# Altium footprint library User.PcbLib: 317 footprints (part 5 of 20)
Each footprint in its own frame and in the unit in brackets; x right, y up, seen from the top. Pads: shape width x height; smd on the part's side, far side on the other; paste and mask are expansions set on the pad; w line width, h text height; cw(c..) or ccw(c..) is an arc to the next point about the centre after c.
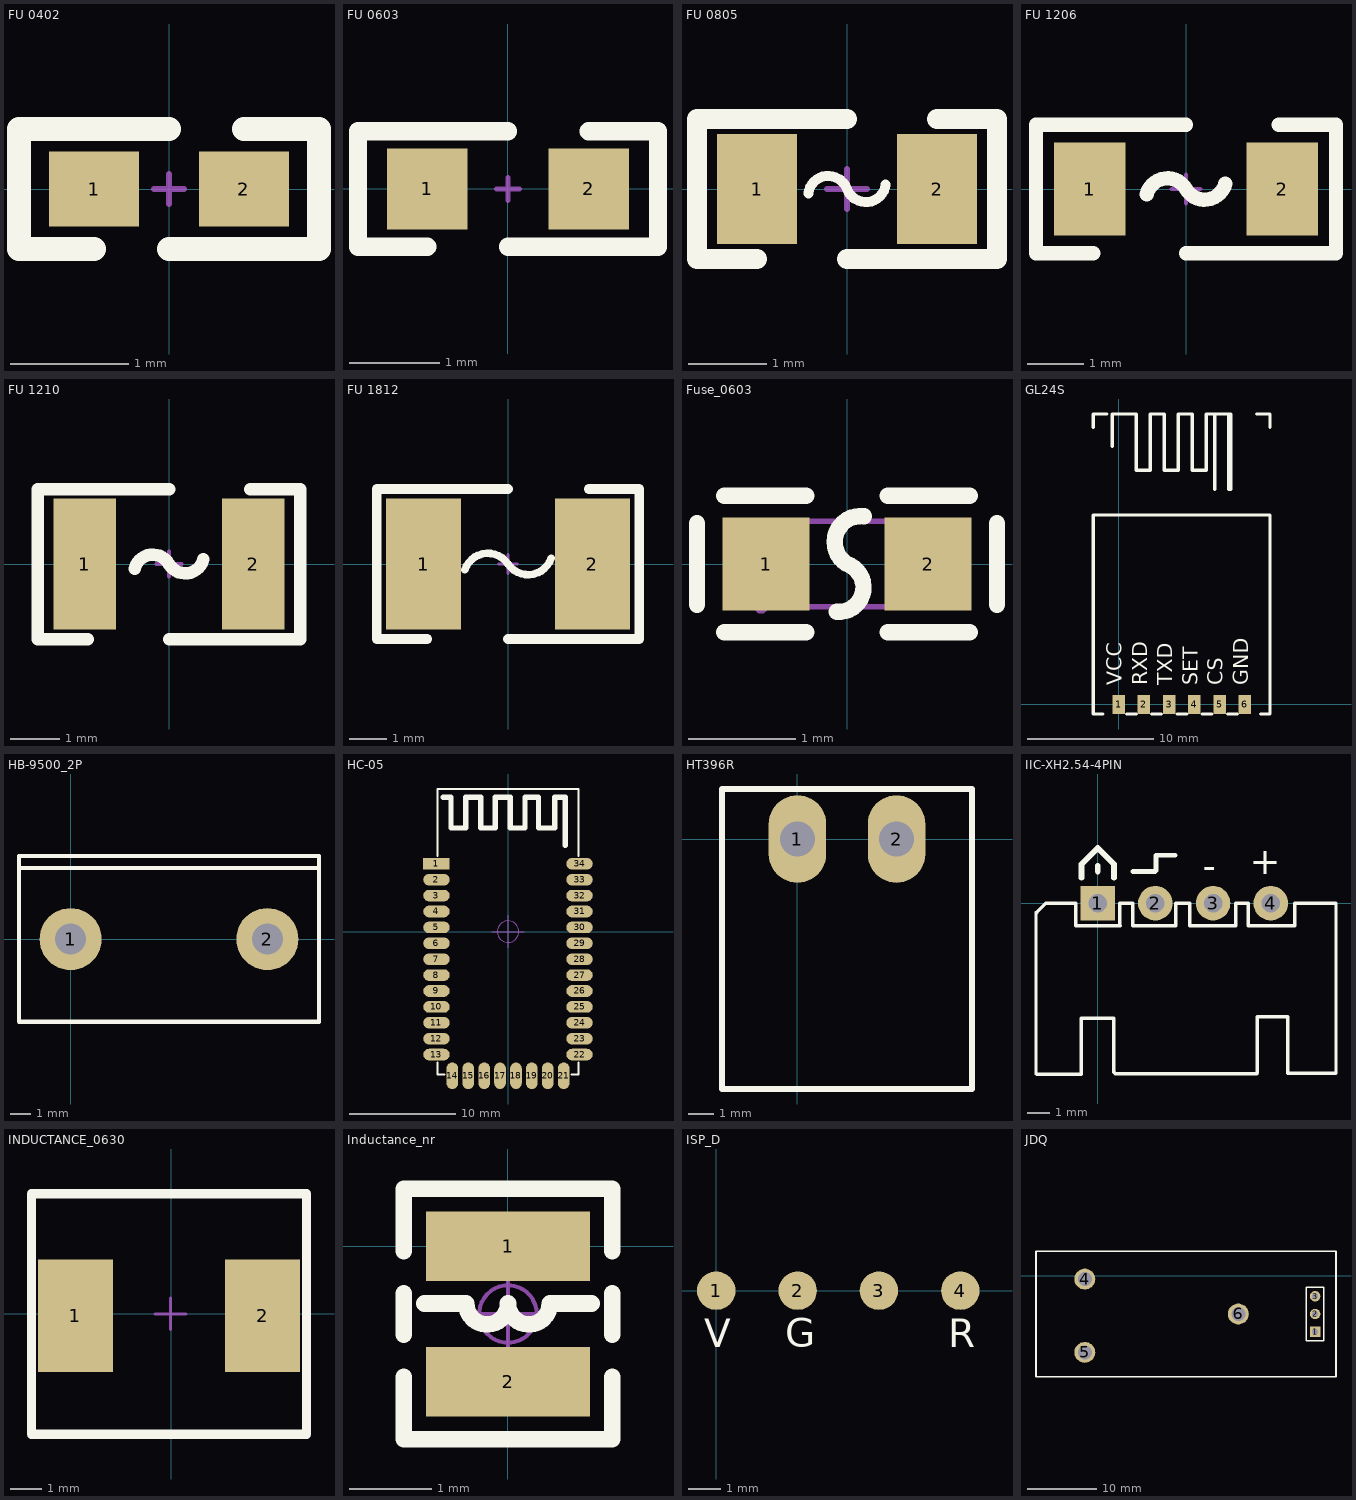
[diagram p4: the footprints below, top view; thin cyan lines are the x and y axes]

## FU 0402 [mil] "贴片保险丝"
pads (2):
  rect 30x25 smd: 1(-25,0) 2(25,0)
Top Overlay:
  lines w8: -25,-20 -50,-20 -50,20 -40,20 -25,20 0,20 ; 0,-20 25,-20 50,-20 50,20 25,20
Mechanical 15:
  lines w2: -5,0 5,0 ; 0,-5 0,5
3D body "FU 0402.STEP": height 14.57, standoff 0, extent -19.69,-10.24 19.69,10.24

## FU 0603 [mil] "贴片保险丝"
pads (2):
  rect 35x35 smd: 1(-35,0) 2(35,0)
Top Overlay:
  lines w8: -35,-25 -65,-25 -65,25 -40,25 0,25 ; 0,-25 40,-25 65,-25 65,25 35,25
Mechanical 15:
  lines w2: -5,0 5,0 ; 0,-5 0,0 0,5
3D body "FU 0603.STEP": height 20.47, standoff 0, extent -31.5,-16.14 31.5,16.14

## FU 0805 [mil] "贴片保险丝"
pads (2):
  rect 40x55 smd: 1(-45,0) 2(45,0)
Top Overlay:
  lines w5: -19.33,-2.28 cw(c-9.4,-3.42) 0,0 ccw(c9.4,3.42) 19.33,2.28
  lines w10: -45,-35 -75,-35 -75,35 -45,35 0,35 ; 0,-35 60,-35 ; 45,35 75,35 75,-35 50,-35
Mechanical 15:
  lines w3: -10,0 10,0 ; 0,-10 0,10
3D body "FU 0805.STEP": height 20.47, standoff 0, extent -39.37,-24.02 39.37,24.02

## FU 1206 [mil] "贴片保险丝"
pads (2):
  rect 50x65 smd: 1(-67.5,0) 2(67.5,0)
Top Overlay:
  lines w10: -90,45 0,45 ; -65,-45 -105,-45 -105,45 -65,45 ; -27.48,-3.62 cw(c-12.99,-7.5) 0,0 ccw(c12.99,7.5) 27.48,3.62 ; 0,-45 90,-45 ; 65,-45 105,-45 105,45 65,45
Mechanical 15:
  lines w3: -10,0 10,0 ; 0,-10 0,10
3D body "FU 01206.STEP": height 34.25, standoff 0, extent -62.99,-31.89 62.99,31.89

## FU 1210 [mil] "贴片保险丝"
pads (2):
  rect 50x105 smd: 1(-67.5,0) 2(67.5,0)
Top Overlay:
  lines w10: -90,60 0,60 ; -65,-60 -105,-60 -105,60 -65,60 ; -27.48,-3.62 cw(c-12.99,-7.5) 0,0 ccw(c12.99,7.5) 27.48,3.62 ; 0,-60 90,-60 ; 65,-60 105,-60 105,60 65,60
Mechanical 15:
  lines w3: -10,0 10,0 ; 0,-10 0,10
3D body "FU 01210.STEP": height 34.25, standoff 0, extent -62.99,-50.39 62.99,50.39

## FU 1812 [mm] "贴片保险丝"
pads (2):
  rect 2x3.5 smd: 1(-2.25,0) 2(2.25,0)
Top Overlay:
  lines w0.203: -1.15,-0.156 cw(c-0.537,-0.362) 0,0 ccw(c0.537,0.362) 1.15,0.156
  lines w0.254: -2.159,-2 -3.5,-2 -3.5,2 0,2 ; 0,-2 3.5,-2 3.5,2 2.159,2
Mechanical 15:
  lines w0.076: -0.254,0 0.254,0 ; 0,-0.254 0,0.254
3D body "FU 01812.STEP": height 0.87, standoff 0, extent -2.3,-1.61 2.3,1.61

## Fuse_0603 [mil]
pads (2):
  rect 31.8x34 smd mask+2: 1(-29.7,0) 2(29.7,0)
Top Overlay:
  lines w6: -55,-15 -55,15 ; -45,-25 -15,-25 ; -45,25 -15,25 ; -3.78,-17.5 ccw(c-2.98,-8.52) 0,0 ; -0.04,0 cw(c4.98,8.08) 6.21,17.5 ; 15,-25 45,-25 ; 15,25 45,25 ; 55,-15 55,15
Top Paste:
  region: 12.4,-5.4 12.4,5.4 23.2,17 43,17 45.5,14.5 45.5,-14.5 43,-17 23.2,-17
  region: -12.4,-5.4 -12.4,5.4 -23.2,17 -43,17 -45.5,14.5 -45.5,-14.5 -43,-17 -23.2,-17
Mechanical 15:
  region: -29.1,-15.7 -29.1,-14.71 -30.51,-13.3 -32.49,-13.3 -33.9,-14.71 -33.9,-15.7 -33.9,-16.69 -32.49,-18.1 -30.51,-18.1 -29.1,-16.69
  region: -31.5,-15.7 -31.5,15.7 -19.7,15.7 -19.7,-15.7
  region: 31.5,-15.7 31.5,15.7 19.7,15.7 19.7,-15.7
  lines w2: -31.5,-15.7 -31.5,15.7 31.5,15.7 31.5,-15.7 -31.5,-15.7
3D body "3D_PCB5_2022-03-06.step": height 29.5, standoff 1.97, extent -32.92,-17.7 33.95,17.7

## GL24S [mm]
pads (6):
  rect 1x1.5 smd: 1(0,0) 2(2,0) 3(4,0) 4(6,0) 5(8,0) 6(10,0)
Top Overlay:
  lines w0.254: -2,21.922 -2,23 -0.922,23 ; -1.238,-0.762 -2,-0.762 -2,15 12,15 ; -0.508,20.447 -0.508,23 1.397,23 1.397,18.542 2.508,18.542 2.508,23 3.619,23 3.619,18.542 4.73,18.542 4.73,23 5.841,23 5.841,18.542 6.952,18.542 6.952,23 8.877,23 ; 0.635,-0.762 1.397,-0.762 ; 2.635,-0.762 3.397,-0.762 ; 4.635,-0.762 5.397,-0.762 ; 6.635,-0.762 7.397,-0.762 ; 7.62,17.018 7.62,22.987 ; 8.635,-0.762 9.397,-0.762 ; 8.731,22.987 8.731,17.018 8.89,17.018 8.89,22.987 ; 10,15 12,15 ; 10.922,23 12,23 12,21.922 ; 11.238,-0.762 12,-0.762 12,15
  text "GND" at 10.65,1.524 h2.03
  text "CS" at 8.65,1.524 h2.03
  text "SET" at 6.65,1.524 h2.03
  text "TXD" at 4.667,1.524 h2.03
  text "RXD" at 2.667,1.526 h2.03
  text "VCC" at 0.65,1.524 h2.03
3D body: height 1.6, standoff 1, extent -2,-0.762 12,15
3D body: height 1.6, standoff 1, extent -2,15 12,23

## HB-9500_2P [mm] "2p_9.5mm"
pads (2):
  round 3 hole 1.5: 1(0,0) 2(9.5,0)
Top Overlay:
  lines w0.2: -2.489,3.429 11.989,3.429 ; 11.989,-4 11.989,4 ; 11.989,-3.988 -2.489,-3.988 -2.489,4.013 11.989,4.013
3D body: height 9, standoff 0, extent -2.489,-3.988 11.989,3.429

## HC-05 [mm] "串口蓝牙模块"
pads (34):
  rect 2.5x1.1 smd: 1(-6.75,6.403)
  oval 2.5x1.1 smd: 2(-6.75,4.903) 3(-6.75,3.403) 4(-6.75,1.903) 5(-6.75,0.403) 6(-6.75,-1.097) 7(-6.75,-2.597) 8(-6.75,-4.097) 9(-6.75,-5.597) 10(-6.75,-7.097) 11(-6.75,-8.597) 12(-6.75,-10.097) 13(-6.75,-11.597) 22(6.75,-11.597) 23(6.75,-10.097) 24(6.75,-8.597) 25(6.75,-7.097) 26(6.75,-5.597) 27(6.75,-4.097) 28(6.75,-2.597) 29(6.75,-1.097) 30(6.75,0.403) 31(6.75,1.903) 32(6.75,3.403) 33(6.75,4.903) 34(6.75,6.403)
  oval 1.1x2.5 smd: 14(-5.25,-13.597) 15(-3.75,-13.597) 16(-2.25,-13.597) 17(-0.75,-13.597) 18(0.75,-13.597) 19(2.25,-13.597) 20(3.75,-13.597) 21(5.25,-13.597)
Top Overlay:
  lines w0.203: -6.647,-12.37 -6.647,-13.487 -6.012,-13.487 ; -6.647,7.163 -6.647,13.462 6.637,13.462 6.637,7.163 ; 6.002,-13.487 6.637,-13.487 6.637,-12.37
  lines w0.508: -6.139,12.7 -5.377,12.7 -5.377,9.779 -3.98,9.779 -3.98,12.7 -2.583,12.7 -2.583,9.779 -1.186,9.779 -1.186,12.7 0.211,12.7 0.211,9.779 1.608,9.779 1.608,12.7 2.878,12.7 2.878,9.779 4.402,9.779 4.402,12.7 5.418,12.7 5.418,8.128
Mechanical 15:
  circle w0.1: c0,0.003 r1.016
  lines w0.1: -1.524,0.003 1.524,0.003 ; 0,-1.521 0,1.527
3D body "HC-05.STEP": height 2.46, standoff -0.01, extent -6.52,-13.367 6.52,13.353

## HT396R [mm] "3.96MM"
pads (2):
  oval 2.3x3.5 hole 1.4: 1(0,0) 2(3.96,0)
Top Overlay:
  lines w0.254: -3.02,-10 6.98,-10 6.98,2 -3.02,2 -3.02,-10
Mechanical 15:
  lines w0.1: -3.1,-10 -3.1,2 7.06,2 7.06,-10 -3.1,-10
3D body "Header-2EDGR-5.08-2.STEP": height 8.6, standoff -3.5, extent -3.1,-10 7.06,2.002

## IIC-XH2.54-4PIN [mil] "-XH2.54-4PIN-"
pads (4):
  rect 60x60 hole 32: 1(0,0)
  round 60 hole 32: 2(100,0) 3(200,0) 4(300,0)
Top Overlay:
  lines w6.06: 26.14,-199.13 -28.11,-199.13 -28.11,-296.38 -105.91,-296.38 -106.93,-295.35 -106.93,-16.93 -103.07,-13.07 -90,0 -38.35,0 -38.35,-38.66 -37.8,-39.21 39.21,-39.21 38.66,-38.66 38.66,0 61.18,0 61.18,-39.45 134.65,-39.45 135.2,-38.9 135.2,0 ; 28.19,-199.13 28.19,-293.31 30.24,-295.35 275.91,-295.35 276.93,-294.33 276.93,-198.11 ; 135.67,0 159.21,0 ; 159.76,-39.21 159.76,0 ; 160.55,-39.21 238.82,-39.21 239.06,-38.98 239.06,0 260.55,0 ; 261.1,0 261.1,-39.45 341.97,-39.45 ; 276.93,-197.09 329.13,-197.09 329.61,-197.56 329.61,-294.88 413.07,-294.88 413.07,0 343.54,0 ; 341.97,-38.43 341.97,0
  lines w8: 61.18,55 100,55 101,56 101,83 134.65,83
  lines w10: -28.11,44 -28.11,67.62 0,95.73 28.11,67.62 28.11,44 ; 0,55 0,65
  text "-" at 182,92.23 h80
  text "+" at 317,34.23 h80
3D body "HDR2.54xV4.STEP": height 236.11, standoff -78.63, extent -105,-300 415,10.75

## INDUCTANCE_0630 [mm]
pads (2):
  rect 2.4x3.6 smd: 1(-3.074,-0.052) 2(2.926,-0.052)
Top Overlay:
  lines w0.3: -4.474,-3.852 -4.474,3.848 4.326,3.848 4.326,-3.852 -4.474,-3.852
Mechanical 15:
  lines w0.1: -0.525,0 0.475,0 ; -0.025,-0.5 -0.025,0.5
3D body "Iductor-CDRH-74.step": height 4.5, standoff 0, extent -4.025,-3.7 3.975,3.7

## Inductance_nr [mm]
pads (2):
  rect 2x0.85 smd: 1(0,0) 2(0,-1.65)
Top Overlay:
  lines w0.203: -1.27,-1.587 -1.27,-2.349 1.27,-2.349 1.27,-1.587 ; -1.27,-1.079 -1.27,-0.571 ; -1.27,-0.063 -1.27,0.699 1.27,0.699 1.27,-0.063 ; -1.016,-0.698 -0.508,-0.698 ccw(c-0.254,-0.698) 0,-0.698 ccw(c0.254,-0.698) 0.508,-0.698 1.016,-0.698 ; 1.27,-1.079 1.27,-0.571
Mechanical 15:
  circle w0.05: c0,-0.825 r0.35
  lines w0.05: -0.5,-0.825 0.5,-0.825 ; 0,-1.325 0,-0.325
3D body "NR2520.STEP": height 1.1, standoff 0, extent -1,-2.075 1,0.425

## ISP_D [mm]
pads (4):
  round 1.2 smd: 1(0,0) 2(2.54,0) 3(5.08,0) 4(7.62,0)
Top Overlay:
  text "R" at 7.24,-2.056 h1.52
  text "V" at -0.381,-2.056 h1.52
  text "G" at 2.159,-2.043 h1.52

## JDQ [mm]
pads (6):
  rect 1.5x1.5 hole 0.9: 1(48.5,-8.04)
  round 1.5 hole 0.9: 2(48.5,-5.5) 3(48.5,-2.96)
  round 3 hole 2: 4(15.5,-0.5) 5(15.5,-11) 6(37.5,-5.5)
Top Overlay:
  lines w0.2: 47.23,-9.31 49.77,-9.31 49.77,-1.69 47.23,-1.69 47.23,-9.31
  lines w0.254: 8.5,-14.5 8.5,3.5 51.5,3.5 51.5,-14.5 8.5,-14.5